# Altium footprint library WR-TBL_Pluggable PCB Header.PcbLib: 719 footprints (part 33 of 45)
Each footprint in its own frame and in the unit in brackets; x right, y up, seen from the top. Pads: shape width x height; smd on the part's side, far side on the other; paste and mask are expansions set on the pad; w line width, h text height; cw(c..) or ccw(c..) is an arc to the next point about the centre after c.
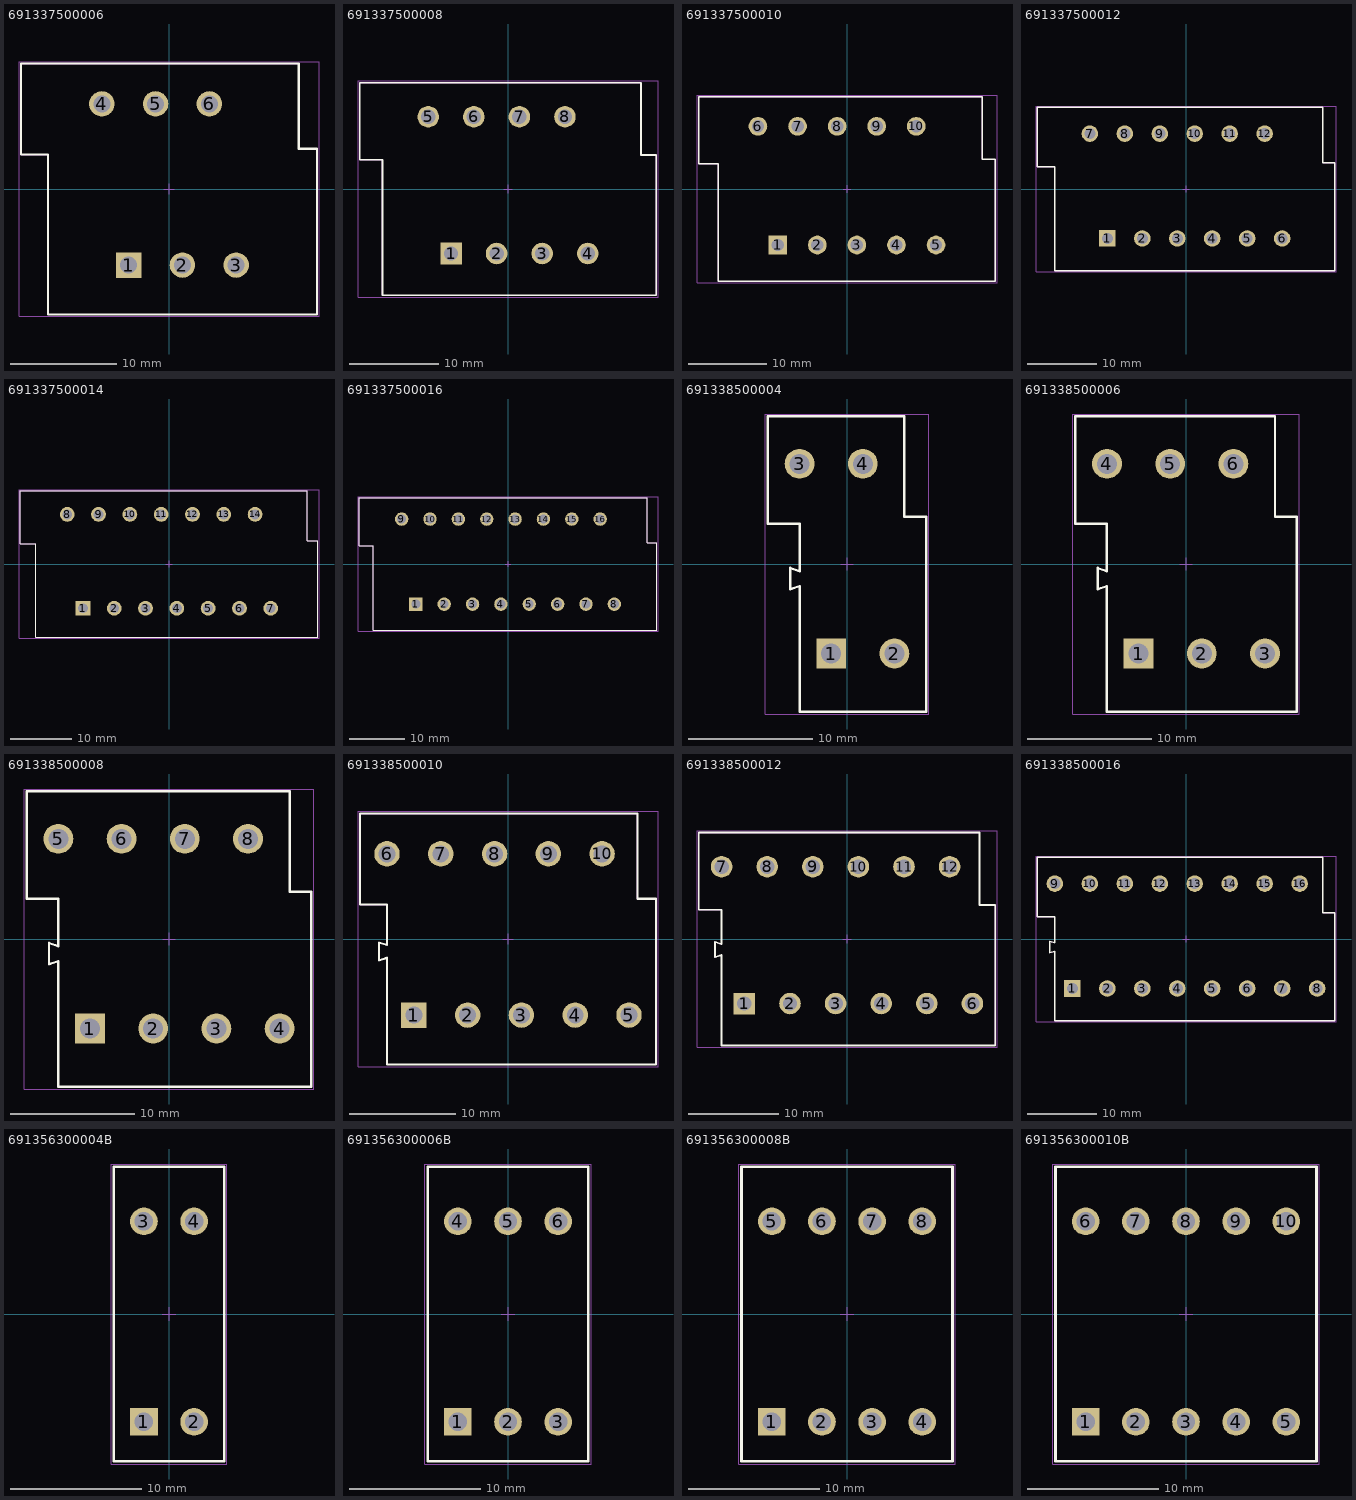
[diagram p32: the footprints below, top view; thin cyan lines are the x and y axes]

## 691337500006 [mm] "Double Level Vertical Male PCB Header with Flanges & Nut Type, pitch 5.08mm, 06p"
height 22
pads (6):
  rect 2.4x2.4 hole 1.6: 1(-3.81,-7.19)
  round 2.4 hole 1.6: 2(1.27,-7.19) 3(6.35,-7.19) 4(-6.35,8.05) 5(-1.27,8.05) 6(3.81,8.05)
Top Overlay:
  lines w0.2: -13.98,3.25 -13.98,11.85 12.27,11.85 12.27,3.8 13.98,3.8 13.98,-11.85 -11.45,-11.85 -11.45,3.25 -13.98,3.25
Mechanical 13:
  lines w0.1: -13.98,3.25 -11.45,3.25 -11.45,-11.85 13.98,-11.85 13.98,3.8 12.27,3.8 12.27,11.85 -13.98,11.85 -13.98,3.25
Mechanical 15:
  lines w0.05: -0.5,0 0.5,0 ; 0,-0.5 0,0.5 ; -14.18,-12.05 -14.18,12.05 14.18,12.05 14.18,-12.05 -14.18,-12.05
3D body "691337500006.stp": height 22.1, standoff -3.8, extent -13.97,-11.85 13.97,11.85

## 691337500008 [mm] "Double Level Vertical Male PCB Header with Flanges & Nut Type, pitch 5.08mm, 08p"
height 22
pads (8):
  rect 2.4x2.4 hole 1.6: 1(-6.35,-7.19)
  round 2.4 hole 1.6: 2(-1.27,-7.19) 3(3.81,-7.19) 4(8.89,-7.19) 5(-8.89,8.05) 6(-3.81,8.05) 7(1.27,8.05) 8(6.35,8.05)
Top Overlay:
  lines w0.2: -16.52,3.25 -16.52,11.85 14.81,11.85 14.81,3.8 16.52,3.8 16.52,-11.85 -13.99,-11.85 -13.99,3.25 -16.52,3.25
Mechanical 13:
  lines w0.1: -16.52,3.25 -13.99,3.25 -13.99,-11.85 16.52,-11.85 16.52,3.8 14.81,3.8 14.81,11.85 -16.52,11.85 -16.52,3.25
Mechanical 15:
  lines w0.05: -0.5,0 0.5,0 ; 0,-0.5 0,0.5 ; -16.72,-12.05 -16.72,12.05 16.72,12.05 16.72,-12.05 -16.72,-12.05
3D body "691337500008.stp": height 22.1, standoff -3.8, extent -16.51,-11.85 16.51,11.85

## 691337500010 [mm] "Double Level Vertical Male PCB Header with Flanges & Nut Type, pitch 5.08mm, 10p"
height 22
pads (10):
  rect 2.4x2.4 hole 1.6: 1(-8.89,-7.19)
  round 2.4 hole 1.6: 2(-3.81,-7.19) 3(1.27,-7.19) 4(6.35,-7.19) 5(11.43,-7.19) 6(-11.43,8.05) 7(-6.35,8.05) 8(-1.27,8.05) 9(3.81,8.05) 10(8.89,8.05)
Top Overlay:
  lines w0.2: -19.06,3.25 -16.53,3.25 -16.53,-11.85 19.06,-11.85 19.06,3.8 17.35,3.8 17.35,11.85 -19.06,11.85 -19.06,3.25
Mechanical 13:
  lines w0.1: -19.06,3.25 -19.06,11.85 17.35,11.85 17.35,3.8 19.06,3.8 19.06,-11.85 -16.53,-11.85 -16.53,3.25 -19.06,3.25
Mechanical 15:
  lines w0.05: -0.5,0 0.5,0 ; 0,-0.5 0,0.5 ; -19.26,-12.05 19.26,-12.05 19.26,12.05 -19.26,12.05 -19.26,-12.05
3D body "691337500010.stp": height 22.1, standoff -3.8, extent -19.05,-11.85 19.05,11.85

## 691337500012 [mm] "Double Level Vertical Male PCB Header with Flanges & Nut Type, pitch 5.08mm, 12p"
height 22
pads (12):
  rect 2.4x2.4 hole 1.6: 1(-11.43,-7.19)
  round 2.4 hole 1.6: 2(-6.35,-7.19) 3(-1.27,-7.19) 4(3.81,-7.19) 5(8.89,-7.19) 6(13.97,-7.19) 7(-13.97,8.05) 8(-8.89,8.05) 9(-3.81,8.05) 10(1.27,8.05) 11(6.35,8.05) 12(11.43,8.05)
Top Overlay:
  lines w0.2: -21.6,3.25 -21.6,11.85 19.89,11.85 19.89,3.8 21.6,3.8 21.6,-11.85 -19.07,-11.85 -19.07,3.25 -21.6,3.25
Mechanical 13:
  lines w0.1: -21.6,3.25 -19.07,3.25 -19.07,-11.85 21.6,-11.85 21.6,3.8 19.89,3.8 19.89,11.85 -21.6,11.85 -21.6,3.25
Mechanical 15:
  lines w0.05: -0.5,0 0.5,0 ; 0,-0.5 0,0.5 ; -21.8,-12.05 -21.8,12.05 21.8,12.05 21.8,-12.05 -21.8,-12.05
3D body "691337500012.stp": height 22.1, standoff -3.8, extent -21.6,-11.85 21.58,11.85

## 691337500014 [mm] "Double Level Vertical Male PCB Header with Flanges & Nut Type, pitch 5.08mm, 14p"
height 22
pads (14):
  rect 2.4x2.4 hole 1.6: 1(-13.97,-7.19)
  round 2.4 hole 1.6: 2(-8.89,-7.19) 3(-3.81,-7.19) 4(1.27,-7.19) 5(6.35,-7.19) 6(11.43,-7.19) 7(16.51,-7.19) 8(-16.51,8.05) 9(-11.43,8.05) 10(-6.35,8.05) 11(-1.27,8.05) 12(3.81,8.05) 13(8.89,8.05) 14(13.97,8.05)
Top Overlay:
  lines w0.2: -24.14,3.25 -24.14,11.85 22.43,11.85 22.43,3.8 24.14,3.8 24.14,-11.85 -21.61,-11.85 -21.61,3.25 -24.14,3.25
Mechanical 13:
  lines w0.1: -24.14,3.25 -21.61,3.25 -21.61,-11.85 24.14,-11.85 24.14,3.8 22.43,3.8 22.43,11.85 -24.14,11.85 -24.14,3.25
Mechanical 15:
  lines w0.05: -0.5,0 0.5,0 ; 0,-0.5 0,0.5 ; -24.34,-12.05 -24.34,12.05 24.34,12.05 24.34,-12.05 -24.34,-12.05
3D body "691337500014 (rev1).stp": height 22.1, standoff -3.8, extent -24.13,-11.85 24.13,11.85

## 691337500016 [mm] "Double Level Vertical Male PCB Header with Flanges & Nut Type, pitch 5.08mm, 16p"
height 22
pads (16):
  rect 2.4x2.4 hole 1.6: 1(-16.51,-7.19)
  round 2.4 hole 1.6: 2(-11.43,-7.19) 3(-6.35,-7.19) 4(-1.27,-7.19) 5(3.81,-7.19) 6(8.89,-7.19) 7(13.97,-7.19) 8(19.05,-7.19) 9(-19.05,8.05) 10(-13.97,8.05) 11(-8.89,8.05) 12(-3.81,8.05) 13(1.27,8.05) 14(6.35,8.05) 15(11.43,8.05) 16(16.51,8.05)
Top Overlay:
  lines w0.2: -26.68,3.25 -26.68,11.85 24.97,11.85 24.97,3.8 26.68,3.8 26.68,-11.85 -24.15,-11.85 -24.15,3.25 -26.68,3.25
Mechanical 13:
  lines w0.1: -26.68,3.25 -24.15,3.25 -24.15,-11.85 26.68,-11.85 26.68,3.8 24.97,3.8 24.97,11.85 -26.68,11.85 -26.68,3.25
Mechanical 15:
  lines w0.05: -0.5,0 0.5,0 ; 0,-0.5 0,0.5 ; -26.88,-12.05 -26.88,12.05 26.88,12.05 26.88,-12.05 -26.88,-12.05
3D body "691337500016.stp": height 22.1, standoff -3.8, extent -26.67,-11.85 26.67,11.85

## 691338500004 [mm] "Double Level Vertical Male PCB Header, pitch 5.08mm, 04p"
height 22
pads (4):
  rect 2.4x2.4 hole 1.6: 1(-1.27,-7.19)
  round 2.4 hole 1.6: 2(3.81,-7.19) 3(-3.81,8.05) 4(1.27,8.05)
Top Overlay:
  lines w0.2: -6.35,3.25 -3.81,3.25 -3.81,-0.57 -4.56,-0.32 -4.56,-2.02 -3.81,-1.77 -3.81,-11.85 6.35,-11.85 6.35,3.8 4.61,3.8 4.61,11.85 -6.35,11.85 -6.35,3.25
Mechanical 13:
  lines w0.1: -6.35,3.25 -6.35,11.85 4.61,11.85 4.61,3.8 6.35,3.8 6.35,-11.85 -3.81,-11.85 -3.81,-1.77 -4.56,-2.02 -4.56,-0.32 -3.81,-0.57 -3.81,3.25 -6.35,3.25
Mechanical 15:
  lines w0.05: -0.5,0 0.5,0 ; 0,-0.5 0,0.5 ; -6.55,-12.05 -6.55,12.05 6.55,12.05 6.55,-12.05 -6.55,-12.05
3D body "691338500004.stp": height 22.1, standoff -3.8, extent -6.35,-11.85 6.35,11.85

## 691338500006 [mm] "Double Level Vertical Male PCB Header, pitch 5.08mm, 06p"
height 22
pads (6):
  rect 2.4x2.4 hole 1.6: 1(-3.81,-7.19)
  round 2.4 hole 1.6: 2(1.27,-7.19) 3(6.35,-7.19) 4(-6.35,8.05) 5(-1.27,8.05) 6(3.81,8.05)
Top Overlay:
  lines w0.2: -8.89,3.25 -8.89,11.85 7.15,11.85 7.15,3.8 8.89,3.8 8.89,-11.85 -6.35,-11.85 -6.35,-1.77 -7.1,-2.02 -7.1,-0.32 -6.35,-0.57 -6.35,3.25 -8.89,3.25
Mechanical 13:
  lines w0.1: -8.89,3.25 -6.35,3.25 -6.35,-0.57 -7.1,-0.32 -7.1,-2.02 -6.35,-1.77 -6.35,-11.85 8.89,-11.85 8.89,3.8 7.15,3.8 7.15,11.85 -8.89,11.85 -8.89,3.25
Mechanical 15:
  lines w0.05: -0.5,0 0.5,0 ; 0,-0.5 0,0.5 ; -9.09,-12.05 9.09,-12.05 9.09,12.05 -9.09,12.05 -9.09,-12.05
3D body "691338500006.stp": height 22.1, standoff -3.8, extent -8.89,-11.85 8.89,11.85

## 691338500008 [mm] "Double Level Vertical Male PCB Header, pitch 5.08mm, 08p"
height 22
pads (8):
  rect 2.4x2.4 hole 1.6: 1(-6.35,-7.19)
  round 2.4 hole 1.6: 2(-1.27,-7.19) 3(3.81,-7.19) 4(8.89,-7.19) 5(-8.89,8.05) 6(-3.81,8.05) 7(1.27,8.05) 8(6.35,8.05)
Top Overlay:
  lines w0.2: -11.43,3.25 -8.89,3.25 -8.89,-0.57 -9.64,-0.32 -9.64,-2.02 -8.89,-1.77 -8.89,-11.85 11.43,-11.85 11.43,3.8 9.69,3.8 9.69,11.85 -11.43,11.85 -11.43,3.25
Mechanical 13:
  lines w0.1: -11.43,3.25 -11.43,11.85 9.69,11.85 9.69,3.8 11.43,3.8 11.43,-11.85 -8.89,-11.85 -8.89,-1.77 -9.64,-2.02 -9.64,-0.32 -8.89,-0.57 -8.89,3.25 -11.43,3.25
Mechanical 15:
  lines w0.05: -0.5,0 0.5,0 ; 0,-0.5 0,0.5 ; -11.63,-12.05 -11.63,12.05 11.63,12.05 11.63,-12.05 -11.63,-12.05
3D body "691338500008.stp": height 22.1, standoff -3.8, extent -11.43,-11.85 11.43,11.85

## 691338500010 [mm] "Double Level Vertical Male PCB Header, pitch 5.08mm, 10p"
height 22
pads (10):
  rect 2.4x2.4 hole 1.6: 1(-8.89,-7.19)
  round 2.4 hole 1.6: 2(-3.81,-7.19) 3(1.27,-7.19) 4(6.35,-7.19) 5(11.43,-7.19) 6(-11.43,8.05) 7(-6.35,8.05) 8(-1.27,8.05) 9(3.81,8.05) 10(8.89,8.05)
Top Overlay:
  lines w0.2: -13.97,3.25 -13.97,11.85 12.23,11.85 12.23,3.8 13.97,3.8 13.97,-11.85 -11.43,-11.85 -11.43,-1.77 -12.18,-2.02 -12.18,-0.32 -11.43,-0.57 -11.43,3.25 -13.97,3.25
Mechanical 13:
  lines w0.1: -13.97,3.25 -11.43,3.25 -11.43,-0.57 -12.18,-0.32 -12.18,-2.02 -11.43,-1.77 -11.43,-11.85 13.97,-11.85 13.97,3.8 12.23,3.8 12.23,11.85 -13.97,11.85 -13.97,3.25
Mechanical 15:
  lines w0.05: -0.5,0 0.5,0 ; 0,-0.5 0,0.5 ; -14.17,-12.05 14.17,-12.05 14.17,12.05 -14.17,12.05 -14.17,-12.05
3D body "691338500010.stp": height 22.1, standoff -3.8, extent -13.97,-11.85 13.97,11.85

## 691338500012 [mm] "Double Level Vertical Male PCB Header, pitch 5.08mm, 12p"
height 22
pads (12):
  rect 2.4x2.4 hole 1.6: 1(-11.43,-7.19)
  round 2.4 hole 1.6: 2(-6.35,-7.19) 3(-1.27,-7.19) 4(3.81,-7.19) 5(8.89,-7.19) 6(13.97,-7.19) 7(-13.97,8.05) 8(-8.89,8.05) 9(-3.81,8.05) 10(1.27,8.05) 11(6.35,8.05) 12(11.43,8.05)
Top Overlay:
  lines w0.2: -16.51,3.25 -16.51,11.85 14.77,11.85 14.77,3.8 16.51,3.8 16.51,-11.85 -13.97,-11.85 -13.97,-1.77 -14.72,-2.02 -14.72,-0.32 -13.97,-0.57 -13.97,3.25 -16.51,3.25
Mechanical 13:
  lines w0.1: -16.51,3.25 -13.97,3.25 -13.97,-0.57 -14.72,-0.32 -14.72,-2.02 -13.97,-1.77 -13.97,-11.85 16.51,-11.85 16.51,3.8 14.77,3.8 14.77,11.85 -16.51,11.85 -16.51,3.25
Mechanical 15:
  lines w0.05: -0.5,0 0.5,0 ; 0,-0.5 0,0.5 ; -16.71,-12.05 16.71,-12.05 16.71,12.05 -16.71,12.05 -16.71,-12.05
3D body "691338500012.stp": height 22.1, standoff -3.8, extent -16.51,-11.85 16.51,11.85

## 691338500016 [mm] "Double Level Vertical Male PCB Header, pitch 5.08mm, 16p"
height 22
pads (16):
  rect 2.4x2.4 hole 1.6: 1(-16.51,-7.19)
  round 2.4 hole 1.6: 2(-11.43,-7.19) 3(-6.35,-7.19) 4(-1.27,-7.19) 5(3.81,-7.19) 6(8.89,-7.19) 7(13.97,-7.19) 8(19.05,-7.19) 9(-19.05,8.05) 10(-13.97,8.05) 11(-8.89,8.05) 12(-3.81,8.05) 13(1.27,8.05) 14(6.35,8.05) 15(11.43,8.05) 16(16.51,8.05)
Top Overlay:
  lines w0.2: -21.59,3.25 -19.05,3.25 -19.05,-0.57 -19.8,-0.32 -19.8,-2.02 -19.05,-1.77 -19.05,-11.85 21.59,-11.85 21.59,3.8 19.85,3.8 19.85,11.85 -21.59,11.85 -21.59,3.25
Mechanical 13:
  lines w0.1: -21.59,3.25 -21.59,11.85 19.85,11.85 19.85,3.8 21.59,3.8 21.59,-11.85 -19.05,-11.85 -19.05,-1.77 -19.8,-2.02 -19.8,-0.32 -19.05,-0.57 -19.05,3.25 -21.59,3.25
Mechanical 15:
  lines w0.05: -0.5,0 0.5,0 ; 0,-0.5 0,0.5 ; -21.79,-12.05 -21.79,12.05 21.79,12.05 21.79,-12.05 -21.79,-12.05
3D body "691338500016.stp": height 22.1, standoff -3.8, extent -21.59,-11.85 21.59,11.85

## 691356300004B [mm] "Double Level Vertical Male PCB Header, pitch 3.81mm, 04p"
height 21.9
pads (4):
  rect 2.1x2.1 hole 1.4: 1(-1.905,-8.2)
  round 2.1 hole 1.4: 2(1.905,-8.2) 3(-1.905,7.04) 4(1.905,7.04)
Top Overlay:
  lines w0.2: -4.205,-11.2 4.205,-11.2 4.205,11.2 -4.205,11.2 -4.205,-11.2
Mechanical 13:
  lines w0.1: -4.205,-11.2 -4.205,11.2 4.205,11.2 4.205,-11.2 -4.205,-11.2
Mechanical 15:
  lines w0.05: -0.5,0 0.5,0 ; 0,-0.5 0,0.5 ; -4.405,-11.4 4.405,-11.4 4.405,11.4 -4.405,11.4 -4.405,-11.4
3D body "691356300004B.stp": height 21.95, standoff -3.35, extent -4.205,-11.2 4.205,11.2

## 691356300006B [mm] "Double Level Vertical Male PCB Header, pitch 3.81mm, 06p"
height 21.9
pads (6):
  rect 2.1x2.1 hole 1.4: 1(-3.81,-8.2)
  round 2.1 hole 1.4: 2(0,-8.2) 3(3.81,-8.2) 4(-3.81,7.04) 5(0,7.04) 6(3.81,7.04)
Top Overlay:
  lines w0.2: -6.11,-11.2 6.11,-11.2 6.11,11.2 -6.11,11.2 -6.11,-11.2
Mechanical 13:
  lines w0.1: -6.11,-11.2 -6.11,11.2 6.11,11.2 6.11,-11.2 -6.11,-11.2
Mechanical 15:
  lines w0.05: -0.5,0 0.5,0 ; 0,-0.5 0,0.5 ; -6.31,-11.4 6.31,-11.4 6.31,11.4 -6.31,11.4 -6.31,-11.4
3D body "691356300006B.stp": height 21.95, standoff -3.35, extent -6.11,-11.2 6.11,11.2

## 691356300008B [mm] "Double Level Vertical Male PCB Header, pitch 3.81mm, 08p"
height 21.9
pads (8):
  rect 2.1x2.1 hole 1.4: 1(-5.715,-8.2)
  round 2.1 hole 1.4: 2(-1.905,-8.2) 3(1.905,-8.2) 4(5.715,-8.2) 5(-5.715,7.04) 6(-1.905,7.04) 7(1.905,7.04) 8(5.715,7.04)
Top Overlay:
  lines w0.2: -8.015,-11.2 -8.015,11.2 8.015,11.2 8.015,-11.2 -8.015,-11.2
Mechanical 13:
  lines w0.1: -8.015,-11.2 8.015,-11.2 8.015,11.2 -8.015,11.2 -8.015,-11.2
Mechanical 15:
  lines w0.05: -0.5,0 0.5,0 ; 0,-0.5 0,0.5 ; -8.215,-11.4 -8.215,11.4 8.215,11.4 8.215,-11.4 -8.215,-11.4
3D body "691356300008B.stp": height 21.95, standoff -3.35, extent -8.015,-11.2 8.015,11.2

## 691356300010B [mm] "Double Level Vertical Male PCB Header, pitch 3.81mm, 10p"
height 21.9
pads (10):
  rect 2.1x2.1 hole 1.4: 1(-7.62,-8.2)
  round 2.1 hole 1.4: 2(-3.81,-8.2) 3(0,-8.2) 4(3.81,-8.2) 5(7.62,-8.2) 6(-7.62,7.04) 7(-3.81,7.04) 8(0,7.04) 9(3.81,7.04) 10(7.62,7.04)
Top Overlay:
  lines w0.2: -9.92,-11.2 9.92,-11.2 9.92,11.2 -9.92,11.2 -9.92,-11.2
Mechanical 13:
  lines w0.1: -9.92,-11.2 -9.92,11.2 9.92,11.2 9.92,-11.2 -9.92,-11.2
Mechanical 15:
  lines w0.05: -0.5,0 0.5,0 ; 0,-0.5 0,0.5 ; -10.12,-11.4 10.12,-11.4 10.12,11.4 -10.12,11.4 -10.12,-11.4
3D body "691356300010B.stp": height 21.95, standoff -3.35, extent -9.92,-11.2 9.92,11.2